# Altium footprint library iot_switch.PcbLib: 27 footprints (part 2 of 2)
Each footprint in its own frame and in the unit in brackets; x right, y up, seen from the top. Pads: shape width x height; smd on the part's side, far side on the other; paste and mask are expansions set on the pad; w line width, h text height; cw(c..) or ccw(c..) is an arc to the next point about the centre after c.
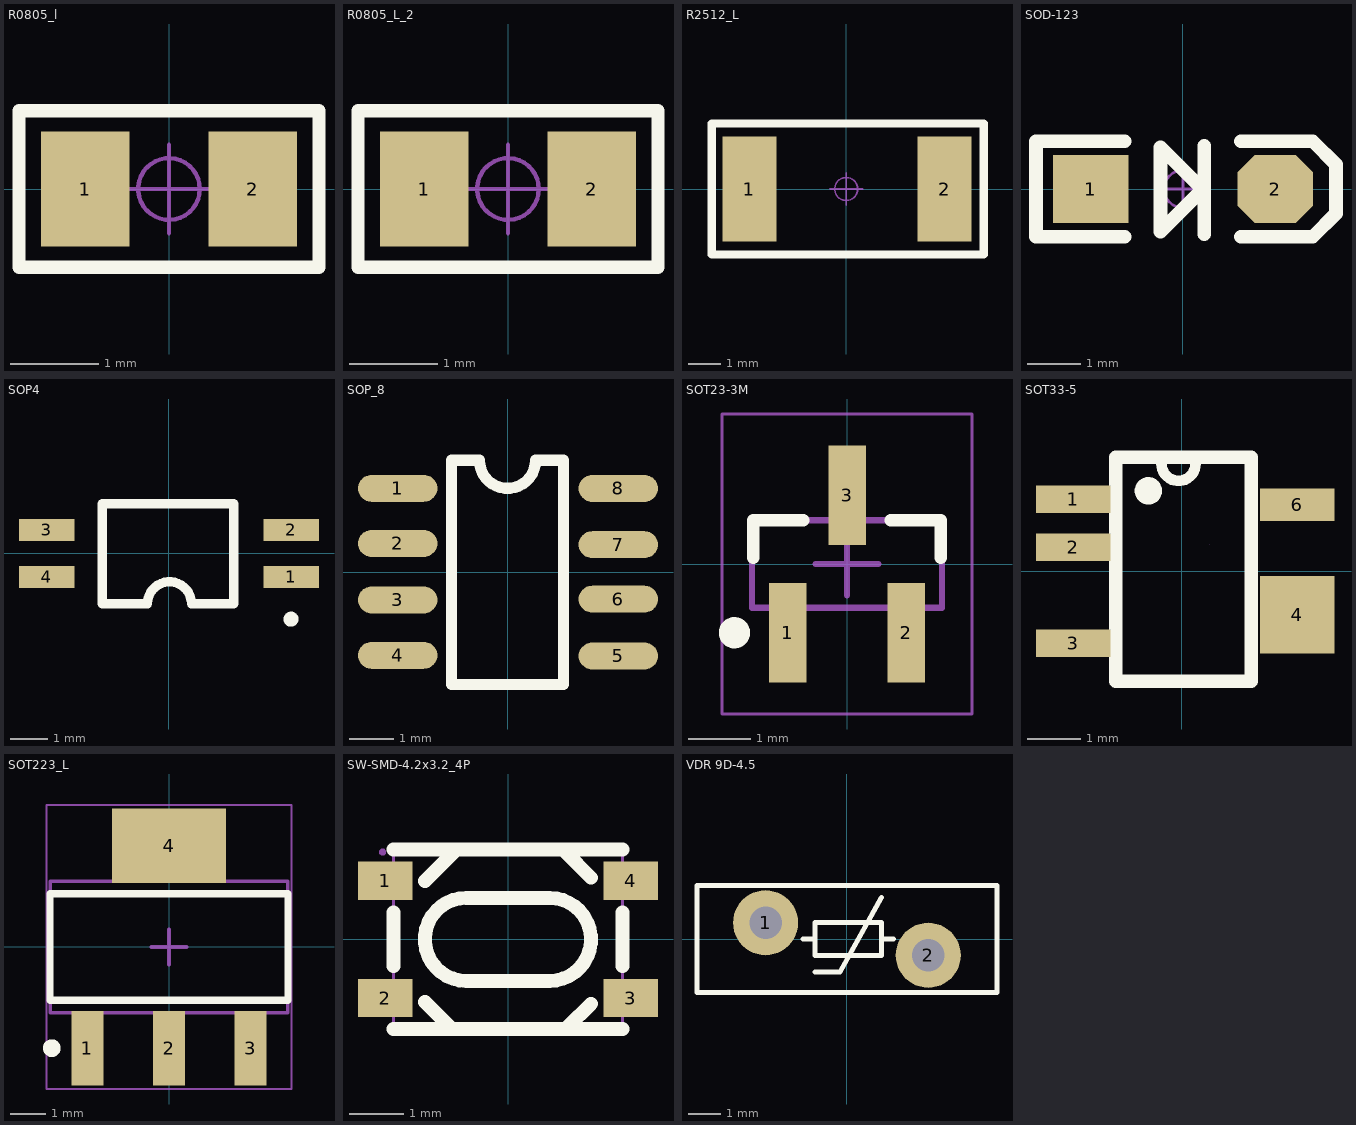
[diagram p1: the footprints below, top view; thin cyan lines are the x and y axes]

## R0805_l [mm] "1/8W贴片电阻"
pads (2):
  rect 1x1.3 smd: 1(-0.95,0) 2(0.95,0)
Top Overlay:
  lines w0.152: -1.702,-0.889 -1.702,0.889 1.702,0.889 1.702,-0.889 -1.702,-0.889
Mechanical 15:
  circle w0.05: c0,0 r0.35
  lines w0.05: -0.5,0 0.5,0 ; 0,-0.5 0,0.5
3D body "R0805-2.stp": height 0.5, standoff 0, extent -1,-0.625 1,0.625

## R0805_L_2 [mm]
pads (2):
  rect 1x1.3 smd: 1(-0.95,0) 2(0.95,0)
Top Overlay:
  lines w0.152: -1.702,-0.889 -1.702,0.889 1.702,0.889 1.702,-0.889 -1.702,-0.889
Mechanical 15:
  circle w0.05: c0,0 r0.35
  lines w0.05: -0.5,0 0.5,0 ; 0,-0.5 0,0.5
3D body "R0805-2.stp": height 0.5, standoff 0, extent -1,-0.625 1,0.625

## R2512_L [mm] "1W贴片电阻                       联系卖家 免费人工查找封装"
pads (2):
  rect 1.65x3.2 smd: 1(-2.95,0) 2(3,0)
Top Overlay:
  lines w0.254: -4.1,-2 -4.1,2 4.2,2 4.2,-2 -4.1,-2
Mechanical 15:
  circle w0.05: c0,0 r0.35
  lines w0.05: -0.5,0 0.5,0 ; 0,-0.5 0,0.5
3D body "R2512-2.stp": height 0.56, standoff 0, extent -3.2,-1.6 3.2,1.6

## SOD-123 [mil] "2.7x1.6X1.1mm（长宽高，不包括引脚） 联系卖家 免费人工查找封装"
pads (2):
  rect 55x50 smd: 1(-67.5,0)
  oct 55x50 smd: 2(67.5,0)
Top Overlay:
  lines w10: -42.5,-35 -107.5,-35 -107.5,35 -42.5,35 ; 14,-0.8 -16.4,-31.2 -16.4,30.5 15.6,-1.5 ; 15.6,-33.1 15.6,31.7 ; 42.5,-35 95,-35 112,-18 112,18 95,35 42.5,35
Mechanical 15:
  circle w1.97: c0,0 r13.78
  lines w1.97: -19.68,0 19.68,0 ; 0,-19.68 0,19.68
3D body "SOD-123.stp": height 50, standoff 1.97, extent -72.84,-31.5 72.83,31.49

## SOP4 [mm] "间距1.27mm     封装库来自淘宝卖家 ID：黄晶宝石"
pads (4):
  rect 1.5x0.6 smd: 1(3.31,-0.635) 2(3.31,0.635) 3(-3.309,0.635) 4(-3.309,-0.635)
Top Overlay:
  circle w0.203: c3.302,-1.778 r0.102
  lines w0.254: -1.805,-1.361 -1.805,1.346 ; -1.794,-1.361 -0.582,-1.361 cw(c0.013,-1.361) 0.608,-1.361 1.751,-1.361 1.751,1.346 -1.786,1.346
3D body "SOP-4.STEP": height 2.1, standoff 0, extent -3.487,-1.361 3.513,1.439

## SOP_8 [mm]
pads (8):
  oval 1.8x0.61 smd: 1(-2.5,1.9) 2(-2.5,0.65) 3(-2.5,-0.63) 4(-2.5,-1.887) 5(2.5,-1.9) 6(2.5,-0.612) 7(2.5,0.625) 8(2.5,1.897)
Top Overlay:
  lines w0.254: -1.281,-2.545 -1.281,2.535 -0.646,2.535 ccw(c-0.011,2.535) 0.624,2.535 1.259,2.535 1.259,-2.545 -1.281,-2.545
3D body "SO-8.STEP": height 1.7, standoff 0, extent -3,-2.47 3,2.43

## SOT23-3M [mm] "SOT23, 3-Leads, Body 2.9x1.3mm, Pitch 0.95mm, Lead Span 2.4mm, IPC Low Density 联系卖家 获取最新版本"
height 1.12
pads (3):
  rect 0.6x1.6 smd: 1(-0.95,-1.1) 2(0.95,-1.1) 3(0,1.1)
Top Overlay:
  circle w0.25: c-1.8,-1.1 r0.125
  lines w0.2: -1.5,0.1 -1.5,0.7 -0.7,0.7 ; 0.7,0.7 1.5,0.7 1.5,0.1
Mechanical 13:
  lines w0.1: -1.52,-0.7 -1.52,0.7 1.52,0.7 1.52,-0.7 -1.52,-0.7
Mechanical 15:
  lines w0.05: -2,-2.4 -2,2.4 2,2.4 2,-2.4 -2,-2.4
  lines w0.1: -0.5,0 0.5,0 ; 0,-0.5 0,0.5
3D body "SOT23-3.STEP": height 1.05, standoff 0, extent -1.5,-1.2 1.5,1.2

## SOT33-5 [mil]
pads (5):
  rect 55x20.22 smd paste+0 mask+2: 1(-80,53) 2(-80,17.57) 3(-80,-53.29)
  rect 55x57.09 smd paste+0 mask+2: 4(85,-32)
  rect 55x23.82 smd paste+0 mask+2: 6(85,49.01)
Top Overlay:
  circle w10: c-24.68,59.18 r5.1
  lines w7.87: -15,79 ccw(c-2.5,79) 10,79
  lines w10: -48.8,-81 -48.8,84 ; -47.7,-81 51.2,-81 51.2,84 -47.15,84
Mechanical 15:
  lines w0.1: 19.99,19.49 20.01,19.51
3D body "SOT33-5.step": height 49.41, standoff 0.01, extent -80.01,-79 86,78.48

## SOT223_L [mm] "SOT223, 4-Leads, Body 6.5x3.5mm, Pitch 2.3mm, Lead Span 7mm, IPC High Density"
height 1.8
pads (4):
  rect 0.9x2.1 smd: 1(-2.3,-2.85) 2(0,-2.85) 3(2.3,-2.85)
  rect 3.2x2.1 smd: 4(0,2.85)
Top Overlay:
  circle w0.25: c-3.3,-2.85 r0.125
  lines w0.2: -3.35,-1.5 3.35,-1.5 3.35,1.5 -3.35,1.5 -3.35,-1.5
Mechanical 13:
  lines w0.1: -3.35,-1.855 3.35,-1.855 3.35,1.855 -3.35,1.855 -3.35,-1.855
Mechanical 15:
  lines w0.05: -3.45,-4 3.45,-4 3.45,4 -3.45,4 -3.45,-4
  lines w0.1: -0.5,0 0.5,0 ; 0,-0.5 0,0.5
3D body "SOT223.STEP": height 1.65, standoff -0.02, extent -3.25,-3.508 3.25,3.508

## SW-SMD-4.2x3.2_4P [mm]
pads (4):
  rect 1.001x0.701 smd mask+0.051: 1(-2.25,1.074) 2(-2.25,-1.074) 3(2.25,-1.074) 4(2.25,1.074)
Top Overlay:
  lines w0.254: -2.101,-1.646 2.101,-1.646 ; -2.101,-0.493 -2.101,0.493 ; -2.101,1.646 2.101,1.646 ; -1.519,-1.151 -1.069,-1.6 ; -1.519,1.074 -0.993,1.6 ; -0.763,-0.761 cw(c-0.763,0.001) -0.763,0.763 ; -0.762,-0.762 0.762,-0.762 ; -0.762,0.762 0.762,0.762 cw(c0.761,0.001) 0.761,-0.761 ; 1.052,1.6 1.519,1.13 ; 1.102,-1.6 1.519,-1.181 ; 2.101,-0.493 2.101,0.493
Mechanical 15:
  region: -2.299,-0.8 -1.801,-0.8 -1.801,-1.349 -2.299,-1.349
  region: 1.801,-0.8 2.299,-0.8 2.299,-1.349 1.801,-1.349
  region: 1.801,1.349 2.299,1.349 2.299,0.8 1.801,0.8
  region: -2.299,1.349 -1.801,1.349 -1.801,0.8 -2.299,0.8
  region: -2.238,1.6 -2.238,1.625 -2.273,1.661 -2.324,1.661 -2.36,1.625 -2.36,1.6 -2.36,1.575 -2.324,1.539 -2.273,1.539 -2.238,1.575
  lines w0.051: -2.101,-1.6 2.101,-1.6 2.101,1.6 -2.101,1.6 -2.101,-1.6
3D body "SW-L4_2-W3_2-2.stp": height 2.52, standoff 0.01, extent -2.325,-1.65 2.325,1.65

## VDR 9D-4.5 [mm] "压敏电阻9mm*4.5mm(直径*厚度）          淘宝ID:黄晶宝石"
pads (2):
  round 2 hole 1: 1(-2.5,0.5) 2(2.5,-0.5)
Top Overlay:
  lines w0.152: -1.357,0 -0.976,0 ; -0.976,-1.016 -0.214,-1.016 1.056,1.27 ; 1.056,0 1.437,0 ; -4.608,-1.651 4.612,-1.651 4.612,1.651 -4.608,1.651 -4.608,-1.651 ; -0.976,-0.508 -0.976,0.508 1.056,0.508 1.056,-0.508 -0.976,-0.508
3D body "9D-4.5.STEP": height 10, standoff -3.5, extent -4.5,-1.5 4.5,1.5